# Altium footprint library ICS.PcbLib: 74 footprints (part 5 of 5)
Each footprint in its own frame and in the unit in brackets; x right, y up, seen from the top. Pads: shape width x height; smd on the part's side, far side on the other; paste and mask are expansions set on the pad; w line width, h text height; cw(c..) or ccw(c..) is an arc to the next point about the centre after c.
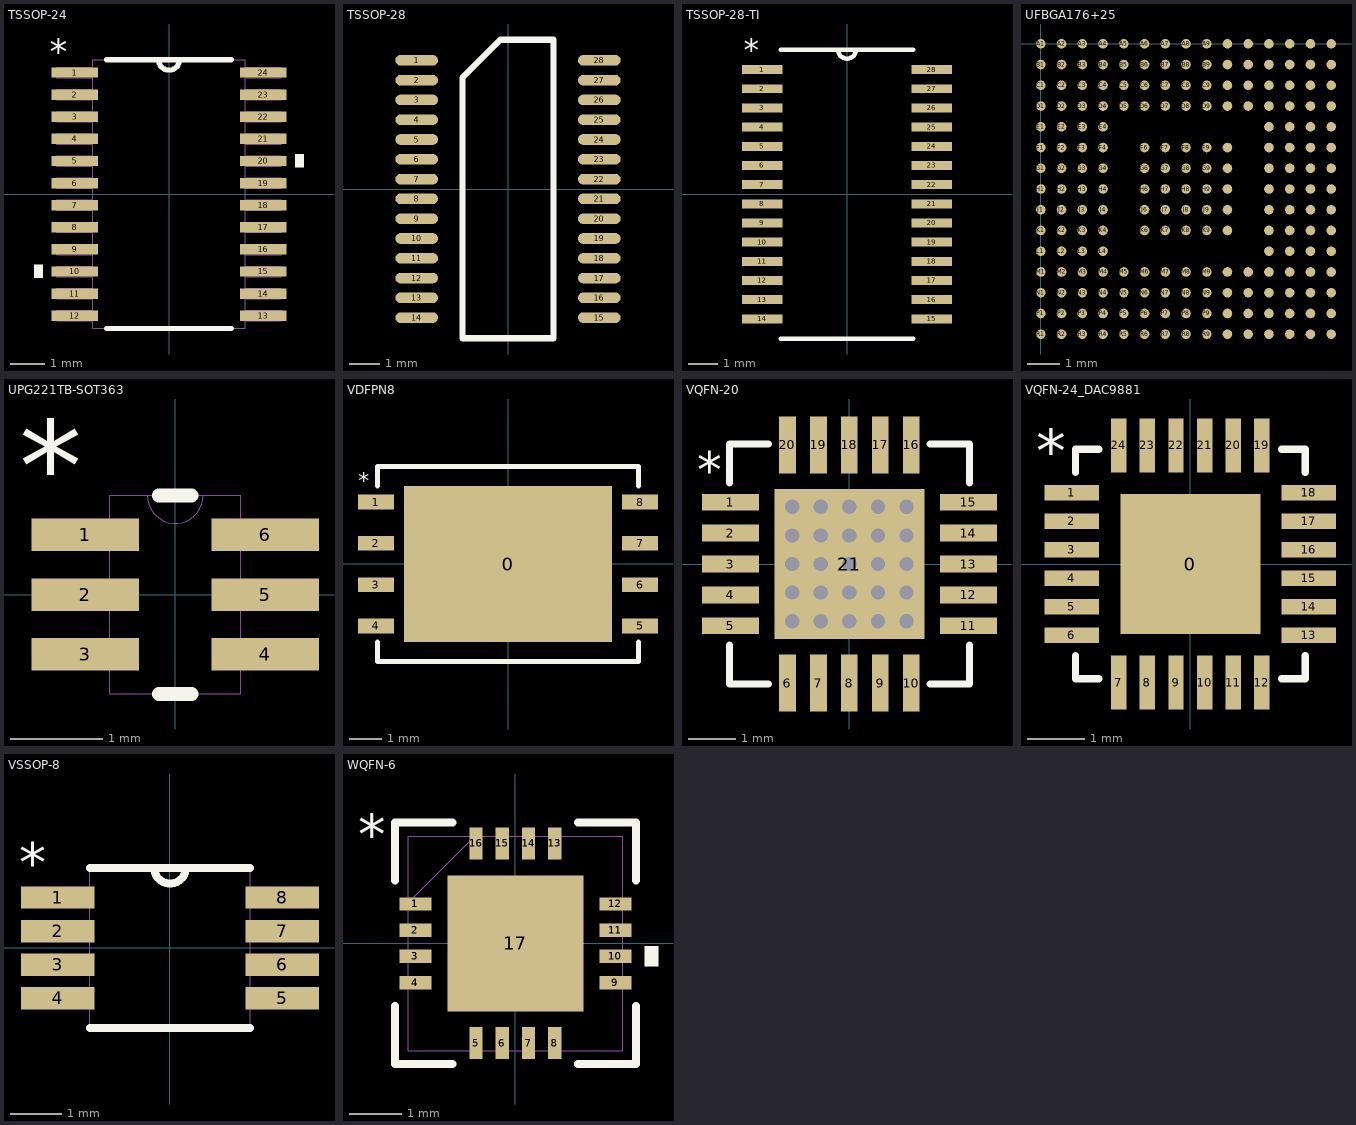
[diagram p4: the footprints below, top view; thin cyan lines are the x and y axes]

## TSSOP-24 [mil]
pads (24):
  rect 54x12 smd: 1(-109,140.75) 2(-109,115.16) 3(-109,89.57) 4(-109,63.98) 5(-109,38.39) 6(-109,12.8) 7(-109,-12.8) 8(-109,-38.39) 9(-109,-63.98) 10(-109,-89.57) 11(-109,-115.16) 12(-109,-140.75) 13(109,-140.75) 14(109,-115.16) 15(109,-89.57) 16(109,-63.98) 17(109,-38.39) 18(109,-12.8) 19(109,12.8) 20(109,38.39) 21(109,63.98) 22(109,89.57) 23(109,115.16) 24(109,140.75)
Top Overlay:
  region: 146,45.89 156,45.89 156,30.89 146,30.89
  region: -146,-82.07 -156,-82.07 -156,-97.07 -146,-97.07
  lines w6: -72.25,-155.5 72.25,-155.5 ; -72.25,155.5 72.25,155.5 ; -12,155.5 ccw(c0,155.5) 12,155.5
  text "*" at -137.8,149.61 h30
Mechanical 1:
  lines w0: -12,155.5 ccw(c0,155.5) 12,155.5 ; -130,-146.75 -88.5,-146.75 -88.5,-134.75 -130,-134.75 -130,-146.75 ; -130,-121.16 -88.5,-121.16 -88.5,-109.16 -130,-109.16 -130,-121.16 ; -130,-95.57 -88.5,-95.57 -88.5,-83.57 -130,-83.57 -130,-95.57 ; -130,-69.98 -88.5,-69.98 -88.5,-57.98 -130,-57.98 -130,-69.98 ; -130,-44.39 -88.5,-44.39 -88.5,-32.39 -130,-32.39 -130,-44.39 ; -130,-18.8 -88.5,-18.8 -88.5,-6.8 -130,-6.8 -130,-18.8 ; -130,6.8 -88.5,6.8 -88.5,18.8 -130,18.8 -130,6.8 ; -130,32.39 -88.5,32.39 -88.5,44.39 -130,44.39 -130,32.39 ; -130,57.98 -88.5,57.98 -88.5,69.98 -130,69.98 -130,57.98 ; -130,83.57 -88.5,83.57 -88.5,95.57 -130,95.57 -130,83.57 ; -130,109.16 -88.5,109.16 -88.5,121.16 -130,121.16 -130,109.16 ; -130,134.75 -88.5,134.75 -88.5,146.75 -130,146.75 -130,134.75 ; -88.5,-155.5 -88.5,155.5 88.5,155.5 88.5,-155.5 -88.5,-155.5 ; 88.5,-146.75 130,-146.75 130,-134.75 88.5,-134.75 88.5,-146.75 ; 88.5,-121.16 130,-121.16 130,-109.16 88.5,-109.16 88.5,-121.16 ; 88.5,-95.57 130,-95.57 130,-83.57 88.5,-83.57 88.5,-95.57 ; 88.5,-69.98 130,-69.98 130,-57.98 88.5,-57.98 88.5,-69.98 ; 88.5,-44.39 130,-44.39 130,-32.39 88.5,-32.39 88.5,-44.39 ; 88.5,-18.8 130,-18.8 130,-6.8 88.5,-6.8 88.5,-18.8 ; 88.5,6.8 130,6.8 130,18.8 88.5,18.8 88.5,6.8 ; 88.5,32.39 130,32.39 130,44.39 88.5,44.39 88.5,32.39 ; 88.5,57.98 130,57.98 130,69.98 88.5,69.98 88.5,57.98 ; 88.5,83.57 130,83.57 130,95.57 88.5,95.57 88.5,83.57 ; 88.5,109.16 130,109.16 130,121.16 88.5,121.16 88.5,109.16 ; 88.5,134.75 130,134.75 130,146.75 88.5,146.75 88.5,134.75
3D body: height 37.4, standoff 0, extent -125.98,-153.54 125.99,153.54

## TSSOP-28 [mm]
pads (28):
  oval 1.4x0.35 smd paste+0 mask+0.051: 1(-3,4.225) 2(-3,3.575) 3(-3,2.925) 4(-3,2.275) 5(-3,1.625) 6(-3,0.975) 7(-3,0.325) 8(-3,-0.325) 9(-3,-0.975) 10(-3,-1.625) 11(-3,-2.275) 12(-3,-2.925) 13(-3,-3.575) 14(-3,-4.225) 15(3,-4.225) 16(3,-3.575) 17(3,-2.925) 18(3,-2.275) 19(3,-1.625) 20(3,-0.975) 21(3,-0.325) 22(3,0.325) 23(3,0.975) 24(3,1.625) 25(3,2.275) 26(3,2.925) 27(3,3.575) 28(3,4.225)
Top Overlay:
  lines w0.2: -1.5,-4.9 -1.5,3.65 -0.25,4.9 1.5,4.9 1.5,-4.9 -1.5,-4.9
3D body: height 1.01, standoff 0.02, extent -3.21,-4.85 3.21,4.85

## TSSOP-28-TI [mil]
pads (28):
  rect 54x12 smd: 1(-112.94,166.34) 2(-112.94,140.75) 3(-112.94,115.16) 4(-112.94,89.57) 5(-112.94,63.98) 6(-112.94,38.39) 7(-112.94,12.8) 8(-112.94,-12.8) 9(-112.94,-38.39) 10(-112.94,-63.98) 11(-112.94,-89.57) 12(-112.94,-115.16) 13(-112.94,-140.75) 14(-112.94,-166.34) 15(112.94,-166.34) 16(112.94,-140.75) 17(112.94,-115.16) 18(112.94,-89.57) 19(112.94,-63.98) 20(112.94,-38.39) 21(112.94,-12.8) 22(112.94,12.8) 23(112.94,38.39) 24(112.94,63.98) 25(112.94,89.57) 26(112.94,115.16) 27(112.94,140.75) 28(112.94,166.34)
Top Overlay:
  lines w6: -88.5,-193 88.5,-193 ; -88.5,193 88.5,193 ; -12,193 ccw(c0,193) 12,193
  text "*" at -137.8,177.17 h30
3D body: height 39.58, standoff 0.6, extent -126.38,-190.94 126.39,190.95

## UFBGA176+25 [mm]
pads (201):
  round 0.3 smd: A1(0,0) A2(0.65,0) A3(1.3,0) A4(1.95,0) A5(2.6,0) A6(3.25,0) A7(3.9,0) A8(4.55,0) A9(5.2,0) A10(5.85,0) A11(6.5,0) A12(7.15,0) A13(7.8,0) A14(8.45,0) A15(9.1,0) B1(0,-0.65) B2(0.65,-0.65) B3(1.3,-0.65) B4(1.95,-0.65) B5(2.6,-0.65) B6(3.25,-0.65) B7(3.9,-0.65) B8(4.55,-0.65) B9(5.2,-0.65) B10(5.85,-0.65) B11(6.5,-0.65) B12(7.15,-0.65) B13(7.8,-0.65) B14(8.45,-0.65) B15(9.1,-0.65) C1(0,-1.3) C2(0.65,-1.3) C3(1.3,-1.3) C4(1.95,-1.3) C5(2.6,-1.3) C6(3.25,-1.3) C7(3.9,-1.3) C8(4.55,-1.3) C9(5.2,-1.3) C10(5.85,-1.3) C11(6.5,-1.3) C12(7.15,-1.3) C13(7.8,-1.3) C14(8.45,-1.3) C15(9.1,-1.3) D1(0,-1.95) D2(0.65,-1.95) D3(1.3,-1.95) D4(1.95,-1.95) D5(2.6,-1.95) D6(3.25,-1.95) D7(3.9,-1.95) D8(4.55,-1.95) D9(5.2,-1.95) D10(5.85,-1.95) D11(6.5,-1.95) D12(7.15,-1.95) D13(7.8,-1.95) D14(8.45,-1.95) D15(9.1,-1.95) E1(0,-2.6) E2(0.65,-2.6) E3(1.3,-2.6) E4(1.95,-2.6) E12(7.15,-2.6) E13(7.8,-2.6) E14(8.45,-2.6) E15(9.1,-2.6) F1(0,-3.25) F2(0.65,-3.25) F3(1.3,-3.25) F4(1.95,-3.25) F6(3.25,-3.25) F7(3.9,-3.25) F8(4.55,-3.25) F9(5.2,-3.25) F10(5.85,-3.25) F12(7.15,-3.25) F13(7.8,-3.25) F14(8.45,-3.25) F15(9.1,-3.25) G1(0,-3.9) G2(0.65,-3.9) G3(1.3,-3.9) G4(1.95,-3.9) G6(3.25,-3.9) G7(3.9,-3.9) G8(4.55,-3.9) G9(5.2,-3.9) G10(5.85,-3.9) G12(7.15,-3.9) G13(7.8,-3.9) G14(8.45,-3.9) G15(9.1,-3.9) H1(0,-4.55) H2(0.65,-4.55) H3(1.3,-4.55) H4(1.95,-4.55) H6(3.25,-4.55) H7(3.9,-4.55) H8(4.55,-4.55) H9(5.2,-4.55) H10(5.85,-4.55) H12(7.15,-4.55) H13(7.8,-4.55) H14(8.45,-4.55) H15(9.1,-4.55) J1(0,-5.2) J2(0.65,-5.2) J3(1.3,-5.2) J4(1.95,-5.2) J6(3.25,-5.2) J7(3.9,-5.2) J8(4.55,-5.2) J9(5.2,-5.2) J10(5.85,-5.2) J12(7.15,-5.2) J13(7.8,-5.2) J14(8.45,-5.2) J15(9.1,-5.2) K1(0,-5.85) K2(0.65,-5.85) K3(1.3,-5.85) K4(1.95,-5.85) K6(3.25,-5.85) K7(3.9,-5.85) K8(4.55,-5.85) K9(5.2,-5.85) K10(5.85,-5.85) K12(7.15,-5.85) K13(7.8,-5.85) K14(8.45,-5.85) K15(9.1,-5.85) L1(0,-6.5) L2(0.65,-6.5) L3(1.3,-6.5) L4(1.95,-6.5) L12(7.15,-6.5) L13(7.8,-6.5) L14(8.45,-6.5) L15(9.1,-6.5) M1(0,-7.15) M2(0.65,-7.15) M3(1.3,-7.15) M4(1.95,-7.15) M5(2.6,-7.15) M6(3.25,-7.15) M7(3.9,-7.15) M8(4.55,-7.15) M9(5.2,-7.15) M10(5.85,-7.15) M11(6.5,-7.15) M12(7.15,-7.15) M13(7.8,-7.15) M14(8.45,-7.15) M15(9.1,-7.15) N1(0,-7.8) N2(0.65,-7.8) N3(1.3,-7.8) N4(1.95,-7.8) N5(2.6,-7.8) N6(3.25,-7.8) N7(3.9,-7.8) N8(4.55,-7.8) N9(5.2,-7.8) N10(5.85,-7.8) N11(6.5,-7.8) N12(7.15,-7.8) N13(7.8,-7.8) N14(8.45,-7.8) N15(9.1,-7.8) P1(0,-8.45) P2(0.65,-8.45) P3(1.3,-8.45) P4(1.95,-8.45) P5(2.6,-8.45) P6(3.25,-8.45) P7(3.9,-8.45) P8(4.55,-8.45) P9(5.2,-8.45) P10(5.85,-8.45) P11(6.5,-8.45) P12(7.15,-8.45) P13(7.8,-8.45) P14(8.45,-8.45) P15(9.1,-8.45) R1(0,-9.1) R2(0.65,-9.1) R3(1.3,-9.1) R4(1.95,-9.1) R5(2.6,-9.1) R6(3.25,-9.1) R7(3.9,-9.1) R8(4.55,-9.1) R9(5.2,-9.1) R10(5.85,-9.1) R11(6.5,-9.1) R12(7.15,-9.1) R13(7.8,-9.1) R14(8.45,-9.1) R15(9.1,-9.1)

## UPG221TB-SOT363 [mil]
pads (6):
  rect 46x14 smd: 1(-38.5,25.59) 2(-38.5,0) 3(-38.5,-25.59) 4(38.5,-25.59) 5(38.5,0) 6(38.5,25.59)
Top Overlay:
  lines w6: -6.93,-42.5 6.93,-42.5 ; -6.93,42.5 6.93,42.5
  text "*" at -66.93,35.43 h39.37
Mechanical 1:
  lines w0: -12,42.5 ccw(c0,42.5) 12,42.5 ; -47.5,-31.59 -28,-31.59 -28,-19.59 -47.5,-19.59 -47.5,-31.59 ; -47.5,-6 -28,-6 -28,6 -47.5,6 -47.5,-6 ; -47.5,19.59 -28,19.59 -28,31.59 -47.5,31.59 -47.5,19.59 ; -28,-42.5 -28,42.5 28,42.5 28,-42.5 -28,-42.5 ; 28,-31.59 47.5,-31.59 47.5,-19.59 28,-19.59 28,-31.59 ; 28,-6 47.5,-6 47.5,6 28,6 28,-6 ; 28,19.59 47.5,19.59 47.5,31.59 28,31.59 28,19.59

## VDFPN8 [mm]
pads (9):
  rect 6.4x4.8 smd: 0(0,0)
  rect 1.1x0.45 smd: 1(-4.06,1.905) 2(-4.06,0.635) 3(-4.06,-0.635) 4(-4.06,-1.905) 5(4.06,-1.905) 6(4.06,-0.635) 7(4.06,0.635) 8(4.06,1.905)
Top Overlay:
  lines w0.152: -4.01,-2.4 -4.01,-3 4.01,-3 4.01,-2.4 ; -4.01,2.4 -4.01,3 4.01,3 4.01,2.4
  text "*" at -4.6,2.3 h0.5
3D body: height 0.94, standoff 0.02, extent -4.01,-3 4.01,3

## VQFN-20 [mm]
pads (21):
  rect 1.2x0.35 smd: 1(-2.5,1.3) 2(-2.5,0.65) 3(-2.5,0) 4(-2.5,-0.65) 5(-2.5,-1.3) 11(2.5,-1.3) 12(2.5,-0.65) 13(2.5,0) 14(2.5,0.65) 15(2.5,1.3)
  rect 0.35x1.2 smd: 6(-1.3,-2.5) 7(-0.65,-2.5) 8(0,-2.5) 9(0.65,-2.5) 10(1.3,-2.5) 16(1.3,2.5) 17(0.65,2.5) 18(0,2.5) 19(-0.65,2.5) 20(-1.3,2.5)
  rect 3.15x3.15 smd: 21(0,0)
via 0.6,-0.6 diameter 0.5 hole 0.3
via 0.6,-1.2 diameter 0.5 hole 0.3
via 1.2,-0.6 diameter 0.5 hole 0.3
via 1.2,-1.2 diameter 0.5 hole 0.3
via -0.6,-0.6 diameter 0.5 hole 0.3
via -0.6,-1.2 diameter 0.5 hole 0.3
via -1.2,-0.6 diameter 0.5 hole 0.3
via -1.2,-1.2 diameter 0.5 hole 0.3
via 1.2,1.2 diameter 0.5 hole 0.3
via 1.2,0.6 diameter 0.5 hole 0.3
via 0.6,1.2 diameter 0.5 hole 0.3
via 0.6,0.6 diameter 0.5 hole 0.3
via -1.2,1.2 diameter 0.5 hole 0.3
via -1.2,0.6 diameter 0.5 hole 0.3
via -0.6,1.2 diameter 0.5 hole 0.3
via -0.6,0.6 diameter 0.5 hole 0.3
via 0,0 diameter 0.5 hole 0.3
via 0.6,0 diameter 0.5 hole 0.3
via 1.2,0 diameter 0.5 hole 0.3
via -1.2,0 diameter 0.5 hole 0.3
via -0.6,0 diameter 0.5 hole 0.3
via 0,0.6 diameter 0.5 hole 0.3
via 0,1.2 diameter 0.5 hole 0.3
via 0,-1.2 diameter 0.5 hole 0.3
via 0,-0.6 diameter 0.5 hole 0.3
Top Overlay:
  lines w0.152: -2.52,-1.7 -2.52,-2.52 -1.7,-2.52 ; -2.52,1.7 -2.52,2.52 -1.7,2.52 ; 1.7,-2.52 2.52,-2.52 2.52,-1.7 ; 1.7,2.52 2.52,2.52 2.52,1.7
  text "*" at -3.2,1.6 h0.76
3D body: height 0.94, standoff 0.02, extent -2.52,-2.52 2.52,2.52

## VQFN-24_DAC9881 [mm]
pads (25):
  rect 2.45x2.45 smd: 0(0,0)
  rect 0.95x0.27 smd: 1(-2.075,1.25) 2(-2.075,0.75) 3(-2.075,0.25) 4(-2.075,-0.25) 5(-2.075,-0.75) 6(-2.075,-1.25) 13(2.075,-1.25) 14(2.075,-0.75) 15(2.075,-0.25) 16(2.075,0.25) 17(2.075,0.75) 18(2.075,1.25)
  rect 0.27x0.95 smd paste+0: 7(-1.25,-2.075) 8(-0.75,-2.075) 9(-0.25,-2.075) 10(0.25,-2.075) 11(0.75,-2.075) 12(1.25,-2.075)
  rect 0.27x0.95 smd: 19(1.25,2.075) 20(0.75,2.075) 21(0.25,2.075) 22(-0.25,2.075) 23(-0.75,2.075) 24(-1.25,2.075)
Top Overlay:
  lines w0.127: -2.01,-1.6 -2.01,-2.01 -1.6,-2.01 ; -2.01,1.6 -2.01,2.01 -1.6,2.01 ; 1.6,-2.01 2.01,-2.01 2.01,-1.6 ; 1.6,2.01 2.01,2.01 2.01,1.6
  text "*" at -2.7,1.6 h0.76
3D body: height 0.94, standoff 0.02, extent -2.01,-2.01 2.01,2.01

## VSSOP-8 [mil]
pads (8):
  rect 56x17 smd: 1(-85.5,38.39) 2(-85.5,12.8) 3(-85.5,-12.8) 4(-85.5,-38.39) 5(85.5,-38.39) 6(85.5,-12.8) 7(85.5,12.8) 8(85.5,38.39)
Top Overlay:
  lines w6: -61,-61 61,-61 ; -61,61 61,61 ; -12,61 ccw(c0,61) 12,61
  text "*" at -115,50 h30
Mechanical 1:
  lines w0: -12,61 ccw(c0,61) 12,61 ; -99.5,-45.89 -61,-45.89 -61,-30.89 -99.5,-30.89 -99.5,-45.89 ; -99.5,-20.3 -61,-20.3 -61,-5.3 -99.5,-5.3 -99.5,-20.3 ; -99.5,5.3 -61,5.3 -61,20.3 -99.5,20.3 -99.5,5.3 ; -99.5,30.89 -61,30.89 -61,45.89 -99.5,45.89 -99.5,30.89 ; -61,-61 -61,61 61,61 61,-61 -61,-61 ; 61,-45.89 99.5,-45.89 99.5,-30.89 61,-30.89 61,-45.89 ; 61,-20.3 99.5,-20.3 99.5,-5.3 61,-5.3 61,-20.3 ; 61,5.3 99.5,5.3 99.5,20.3 61,20.3 61,5.3 ; 61,30.89 99.5,30.89 99.5,45.89 61,45.89 61,30.89

## WQFN-6 [mil]
pads (33):
  rect 24x10 smd paste-5: 1(-75,29.53) 2(-75,9.84) 3(-75,-9.84) 4(-75,-29.53) 9(75,-29.53) 10(75,-9.84) 11(75,9.84) 12(75,29.53)
  rect 24x10 on Top Paste paste-5: 1(-75,29.53) 2(-75,9.84) 3(-75,-9.84) 4(-75,-29.53) 9(75,-29.53) 10(75,-9.84) 11(75,9.84) 12(75,29.53)
  rect 10x24 smd paste-5: 5(-29.53,-75) 6(-9.84,-75) 7(9.84,-75) 8(29.53,-75) 13(29.53,75) 14(9.84,75) 15(-9.84,75) 16(-29.53,75)
  rect 10x24 on Top Paste paste-5: 5(-29.53,-75) 6(-9.84,-75) 7(9.84,-75) 8(29.53,-75) 13(29.53,75) 14(9.84,75) 15(-9.84,75) 16(-29.53,75)
  rect 102x102 smd paste-51: 17(0,0)
Top Overlay:
  region: 97,-2.34 107,-2.34 107,-17.34 97,-17.34
  lines w6: -90.5,-47.15 -90.5,-90.5 -47.15,-90.5 ; -90.5,47.15 -90.5,90.5 -47.15,90.5 ; 47.15,-90.5 90.5,-90.5 90.5,-47.15 ; 47.15,90.5 90.5,90.5 90.5,47.15
  text "*" at -118.11,66.93 h30
Top Paste:
  region: 46.94,-3.94 3.94,-3.94 3.94,-46.94 46.94,-46.94
  region: 46.94,46.94 3.94,46.94 3.94,3.94 46.94,3.94
  region: -3.94,-3.94 -46.94,-3.94 -46.94,-46.94 -3.94,-46.94
  region: -3.94,46.94 -46.94,46.94 -46.94,3.94 -3.94,3.94
Mechanical 1:
  lines w0: -80.5,30.5 -30.5,80.5 ; -80.5,-80.5 -80.5,80.5 80.5,80.5 80.5,-80.5 -80.5,-80.5 ; -80.5,-35.53 -80.5,-23.53 -80.5,-35.53 ; -80.5,-15.84 -80.5,-3.84 -80.5,-15.84 ; -80.5,3.84 -80.5,15.84 -80.5,3.84 ; -80.5,23.53 -80.5,35.53 -80.5,23.53 ; -35.53,-80.5 -23.53,-80.5 -35.53,-80.5 ; -35.53,80.5 -23.53,80.5 -35.53,80.5 ; -15.84,-80.5 -3.84,-80.5 -15.84,-80.5 ; -15.84,80.5 -3.84,80.5 -15.84,80.5 ; 3.84,-80.5 15.84,-80.5 3.84,-80.5 ; 3.84,80.5 15.84,80.5 3.84,80.5 ; 23.53,-80.5 35.53,-80.5 23.53,-80.5 ; 23.53,80.5 35.53,80.5 23.53,80.5 ; 80.5,-35.53 80.5,-23.53 80.5,-35.53 ; 80.5,-15.84 80.5,-3.84 80.5,-15.84 ; 80.5,3.84 80.5,15.84 80.5,3.84 ; 80.5,23.53 80.5,35.53 80.5,23.53